# Altium footprint library mastermind.PCBLIB: 1061 footprints (part 41 of 67)
Each footprint in its own frame and in the unit in brackets; x right, y up, seen from the top. Pads: shape width x height; smd on the part's side, far side on the other; paste and mask are expansions set on the pad; w line width, h text height; cw(c..) or ccw(c..) is an arc to the next point about the centre after c.
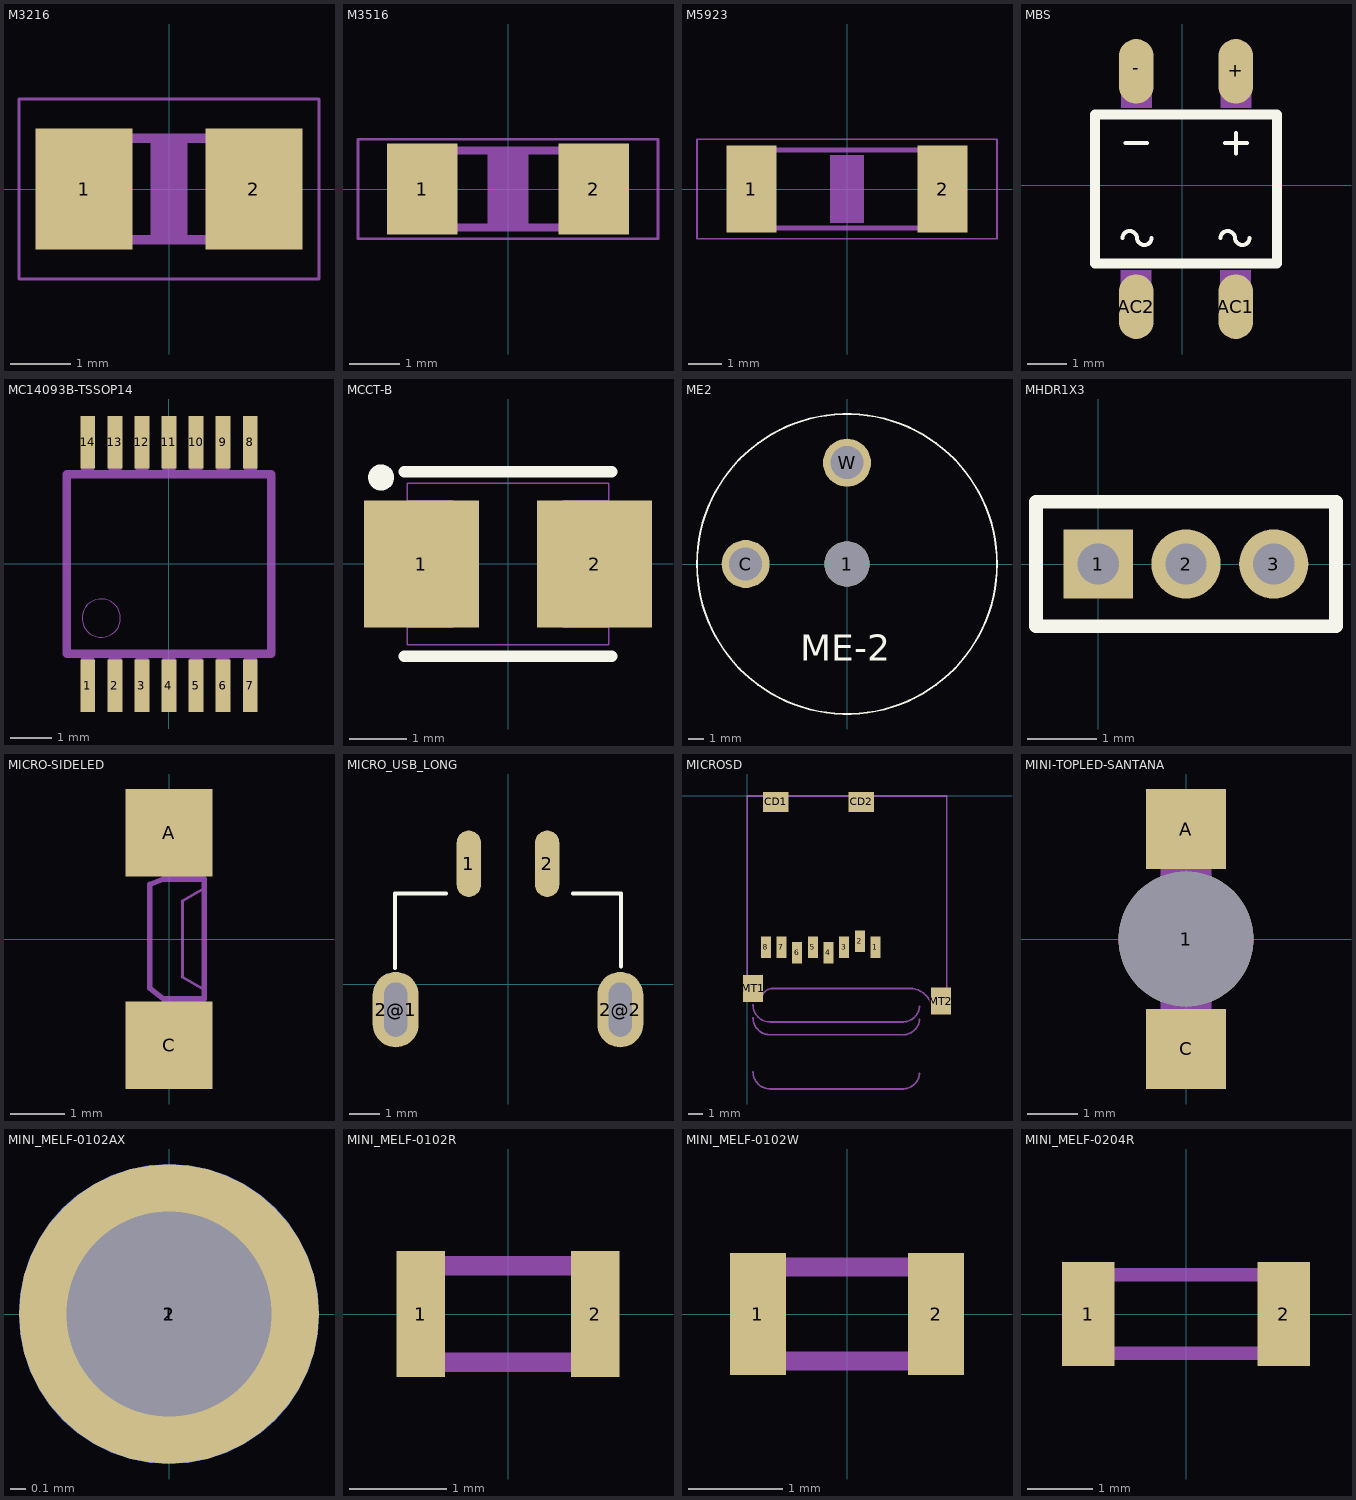
[diagram p40: the footprints below, top view; thin cyan lines are the x and y axes]

## M3216 [mm]
pads (2):
  rect 1.6x2 smd: 1(-1.4,0) 2(1.4,0)
Mechanical 8:
  region: 1.118,-0.914 1.118,0.914 1.702,0.914 1.702,-0.914
  region: -1.702,-0.914 -1.702,0.914 -1.118,0.914 -1.118,-0.914
  lines w0.152: -1.143,-0.838 1.143,-0.838 ; -1.143,0.838 1.143,0.838
Mechanical 30:
  region: -0.3,-0.8 -0.3,0.8 0.3,0.8 0.3,-0.8
Mechanical 29 (Mech34):
  lines w0.051: -2.473,-1.483 -2.473,1.483 2.473,1.483 2.473,-1.483 -2.473,-1.483

## M3516 [mm]
pads (2):
  rect 1.4x1.8 smd: 1(-1.7,0) 2(1.7,0)
Mechanical 2:
  lines w0.152: -0.686,-0.762 0.686,-0.762 ; -0.686,0.762 0.686,0.762
Mechanical 8:
  region: 1.295,-0.838 1.295,0.838 1.854,0.838 1.854,-0.838
  region: -1.854,-0.838 -1.854,0.838 -1.295,0.838 -1.295,-0.838
  lines w0.152: -1.321,-0.762 1.321,-0.762 ; -1.321,0.762 1.321,0.762
Mechanical 30:
  region: -0.4,-0.7 -0.4,0.7 0.4,0.7 0.4,-0.7
Mechanical 29 (Mech34):
  lines w0.051: -2.973,-0.983 -2.973,0.983 2.973,0.983 2.973,-0.983 -2.973,-0.983

## M5923 [mm]
pads (2):
  rect 1.5x2.6 smd: 1(-2.85,0) 2(2.85,0)
Mechanical 2:
  lines w0.152: -1.676,1.168 1.651,1.168 ; -1.651,-1.168 1.651,-1.168
Mechanical 8:
  region: 2.388,-1.245 2.388,1.245 3.048,1.245 3.048,-1.245
  region: -3.048,-1.245 -3.048,1.245 -2.388,1.245 -2.388,-1.245
  lines w0.152: -2.438,1.168 2.413,1.168 ; -2.413,-1.168 2.413,-1.168
Mechanical 30:
  region: -0.5,-1 -0.5,1 0.5,1 0.5,-1
Mechanical 29 (Mech34):
  lines w0.051: -4.473,-1.483 -4.473,1.483 4.473,1.483 4.473,-1.483 -4.473,-1.483

## MBS [mm]
pads (4):
  oval 0.889x1.651 smd: +(1.37,2.9) -(-1.17,2.9) AC1(1.37,-3.1) AC2(-1.17,-3.1)
Top Overlay:
  lines w0.102: -1.525,-1.35 cw(c-1.338,-1.362) -1.15,-1.35 ccw(c-0.962,-1.337) -0.775,-1.35 ; -1.44,1.075 -0.89,1.075 ; 0.975,-1.35 cw(c1.162,-1.362) 1.35,-1.35 ccw(c1.538,-1.337) 1.725,-1.35 ; 1.1,1.075 1.65,1.075 ; 1.375,0.8 1.375,1.325
  lines w0.254: -2.225,-2.005 -2.225,1.805 2.425,1.805 2.425,-2.005 -2.225,-2.005
Mechanical 8:
  region: 0.975,-3.605 0.975,-2.175 1.75,-2.175 1.75,-3.605
  region: -1.565,-3.605 -1.565,-2.175 -0.79,-2.175 -0.79,-3.605
  region: -0.775,3.405 -0.775,1.975 -1.55,1.975 -1.55,3.405
  region: 1.765,3.405 1.765,1.975 0.99,1.975 0.99,3.405
3D body "SOIC-4 (Fairchild).STEP": height 1.75, standoff 0, extent -2.25,-3.327 2.45,2.873

## MC14093B-TSSOP14 [mm]
pads (14):
  rect 0.36x1.26 smd mask-0.63: 1(-1.95,-2.925) 2(-1.3,-2.925) 3(-0.65,-2.925) 4(0,-2.925) 5(0.65,-2.925) 6(1.3,-2.925) 7(1.95,-2.925) 8(1.95,2.925) 9(1.3,2.925) 10(0.65,2.925) 11(0,2.925) 12(-0.65,2.925) 13(-1.3,2.925) 14(-1.95,2.925)
Top Solder:
  region: 1.7,2.2 1.7,3.6 2.2,3.6 2.2,2.2
  region: 1.05,2.2 1.05,3.6 1.55,3.6 1.55,2.2
  region: 0.4,2.2 0.4,3.6 0.9,3.6 0.9,2.2
  region: -0.25,2.2 -0.25,3.6 0.25,3.6 0.25,2.2
  region: -0.9,2.2 -0.9,3.6 -0.4,3.6 -0.4,2.2
  region: -1.55,2.2 -1.55,3.6 -1.05,3.6 -1.05,2.2
  region: -2.2,2.2 -2.2,3.6 -1.7,3.6 -1.7,2.2
  region: 1.7,-3.6 1.7,-2.2 2.2,-2.2 2.2,-3.6
  region: 1.05,-3.6 1.05,-2.2 1.55,-2.2 1.55,-3.6
  region: 0.4,-3.6 0.4,-2.2 0.9,-2.2 0.9,-3.6
  region: -0.25,-3.6 -0.25,-2.2 0.25,-2.2 0.25,-3.6
  region: -0.9,-3.6 -0.9,-2.2 -0.4,-2.2 -0.4,-3.6
  region: -1.55,-3.6 -1.55,-2.2 -1.05,-2.2 -1.05,-3.6
  region: -2.2,-3.6 -2.2,-2.2 -1.7,-2.2 -1.7,-3.6
Mechanical 2:
  circle w0: c-1.625,-1.3 r0.459
  lines w0.203: -2.45,-2.15 -2.45,2.15 2.45,2.15 2.45,-2.15 -2.45,-2.15
Mechanical 8:
  region: -1.8,3.3 -1.8,2.225 -2.1,2.225 -2.1,3.3
  region: -1.15,3.3 -1.15,2.225 -1.45,2.225 -1.45,3.3
  region: -0.5,3.3 -0.5,2.225 -0.8,2.225 -0.8,3.3
  region: 0.15,3.3 0.15,2.225 -0.15,2.225 -0.15,3.3
  region: 0.8,3.3 0.8,2.225 0.5,2.225 0.5,3.3
  region: 1.45,3.3 1.45,2.225 1.15,2.225 1.15,3.3
  region: 2.1,3.3 2.1,2.225 1.8,2.225 1.8,3.3
  region: 1.8,-3.3 1.8,-2.225 2.1,-2.225 2.1,-3.3
  region: 1.15,-3.3 1.15,-2.225 1.45,-2.225 1.45,-3.3
  region: 0.5,-3.3 0.5,-2.225 0.8,-2.225 0.8,-3.3
  region: -0.15,-3.3 -0.15,-2.225 0.15,-2.225 0.15,-3.3
  region: -0.8,-3.3 -0.8,-2.225 -0.5,-2.225 -0.5,-3.3
  region: -1.45,-3.3 -1.45,-2.225 -1.15,-2.225 -1.15,-3.3
  region: -2.1,-3.3 -2.1,-2.225 -1.8,-2.225 -1.8,-3.3

## MCCT-B [mm]
pads (2):
  rect 2x2.2 smd: 1(-1.505,-0.002) 2(1.495,-0.002)
Top Overlay:
  circle w0.25: c-2.205,1.498 r0.1
  lines w0.2: -1.805,-1.602 1.795,-1.602 ; -1.805,1.598 1.795,1.598
Mechanical 15:
  lines w0.025: -1.755,-1.102 -0.955,-1.102 -0.955,1.098 -1.755,1.098 ; 1.745,-1.102 0.945,-1.102 0.945,1.098 1.745,1.098 ; -1.755,-1.402 -1.755,1.398 1.745,1.398 1.745,-1.402 -1.755,-1.402
3D body: height 1.27, standoff 0, extent -2.286,-0.889 2.286,0.889

## ME2 [mm]
pads (3):
  round 3 hole 3 unplated: 1(0,0)
  round 3.2 hole 2.2: C(-6.753,0) W(0,6.753)
Top Overlay:
  circle w0.127: c0,0 r10
  text "ME-2" at -3.111,-7.048 h3
3D body "ME2_Gassensor.STEP": height 16.5, standoff -4, extent -10,-10 10,10

## MHDR1X3 [mm] "Connector; Header; 3 Position"
pads (3):
  rect 1x1 hole 0.6: 1(0,0)
  round 1 hole 0.6: 2(1.27,0) 3(2.54,0)
Top Overlay:
  lines w0.2: -0.9,-0.9 3.44,-0.9 3.44,0.9 -0.9,0.9 -0.9,-0.9

## MICRO-SIDELED [mm]
pads (2):
  rect 1.6x1.6 smd paste-0.8 mask-0.8: A(0,1.95) C(0,-1.95)
Top Paste:
  region: -0.35,-1.75 -0.35,-1.15 0.35,-1.15 0.35,-1.75
  region: -0.35,1.15 -0.35,1.75 0.35,1.75 0.35,1.15
Top Solder:
  region: -0.4,1.1 -0.4,1.8 0.4,1.8 0.4,1.1
  region: -0.4,-1.8 -0.4,-1.1 0.4,-1.1 0.4,-1.8
Mechanical 2:
  lines w0.051: 0.6,-0.9 0.25,-0.7 0.25,0.7 0.6,0.9
  lines w0.102: -0.35,-0.9 -0.35,1 ; 0.65,-1.1 0.65,1.1
Mechanical 8:
  region: -0.125,1.125 -0.125,1.75 0.125,1.75 0.125,1.125
  region: -0.125,-1.75 -0.125,-1.125 0.125,-1.125 0.125,-1.75
  lines w0.102: -0.35,-0.9 -0.1,-1.1 0.65,-1.1 ; -0.35,1 -0.1,1.1 0.65,1.1

## MICRO_USB_LONG [mm]
pads (4):
  oval 0.8x2.2 smd: 1(-1.3,4) 2(1.3,4)
  oval 1.524x2.5 hole 0.762 slot 1.8 at 90 deg: 2@1(-3.725,-0.84) 2@2(3.725,-0.84)
Top Overlay:
  lines w0.127: -3.75,0.546 -3.75,3.01 -2.057,3.01 ; 2.159,3.01 3.75,3.01 3.75,0.597

## MICROSD [mm]
pads (12):
  rect 0.7x1.5 smd: 1(9,-10.64) 2(7.9,-10.24) 3(6.8,-10.64) 4(5.7,-11.04) 5(4.6,-10.64) 6(3.5,-11.04) 7(2.4,-10.64) 8(1.3,-10.64)
  rect 1.8x1.4 smd: CD1(2,-0.44) CD2(8,-0.44)
  rect 1.4x1.9 smd: MT1(0.4,-13.54) MT2(13.6,-14.44)
Mechanical 2:
  lines w0.127: 0.4,-19.4 ccw(c1.6,-19.4) 1.6,-20.6 10.8,-20.6 ccw(c10.9,-19.4) 12.1,-19.5 ; 0.4,-15.6 ccw(c1.6,-15.6) 1.6,-16.8 10.8,-16.8 ccw(c10.9,-15.6) 12.1,-15.7 ; 0.4,-14.7 ccw(c1.6,-14.7) 1.6,-15.9 10.8,-15.9 ccw(c10.9,-14.7) 12.1,-14.8 ; 0,-14.44 0,-0.04 14,-0.04 14,-15.14 13,-15.14 ccw(c11.4,-15.14) 11.4,-13.54 1.7,-13.54 ccw(c1.8,-14.34) 1,-14.44 0,-14.44

## MINI-TOPLED-SANTANA [mm]
pads (3):
  round 2.7 hole 2.7: 1(0,0)
  rect 1.6x1.6 smd paste-0.8 mask-0.8: A(0,2.2) C(0,-2.2)
Top Paste:
  region: -0.5,1.55 -0.5,2.05 0.5,2.05 0.5,1.55
  region: -0.5,-2.05 -0.5,-1.55 0.5,-1.55 0.5,-2.05
Top Solder:
  region: -0.55,-2.1 -0.55,-1.5 0.55,-1.5 0.55,-2.1
  region: -0.55,1.5 -0.55,2.1 0.55,2.1 0.55,1.5
Mechanical 2:
  region: -0.5,-1.4 -0.5,-1.05 0.5,-1.05 0.5,-1.4
  region: -0.5,1 -0.5,1.4 0.5,1.4 0.5,1
  region: -0.2,-0.4 -0.2,-0.05 0.15,-0.05 0.15,-0.4
  lines w0.102: 0.35,-1 0.7,-0.65 ; 0.35,-1 -0.45,-1 -0.7,-1 -0.7,-0.75 -0.7,1 0.7,1 0.7,-0.65 ; 0.35,-1 0.7,-1 0.7,-0.65 ; -0.45,-0.7 -0.45,0.7 0.45,0.7 0.45,-0.7 -0.45,-0.7
Mechanical 8:
  region: -0.5,1.4 -0.5,2.05 0.5,2.05 0.5,1.4
  region: -0.5,-2.1 -0.5,-1.4 0.5,-1.4 0.5,-2.1

## MINI_MELF-0102AX [mm]
pads (3):
  rrect100% 1.9x1.9 smd: 1(0,0)
  round 1.3 hole 1.3: 1(0,0)
  rrect100% 1.9x1.9 smd far side: 2(0,0)
Mechanical 8:
  circle w0: c0,0 r0.6
Mechanical 9:
  circle w0: c0,0 r0.6

## MINI_MELF-0102R [mm]
pads (2):
  rect 0.5x1.3 smd: 1(-0.9,0) 2(0.9,0)
Mechanical 8:
  lines w0.203: -1,-0.5 1,-0.5 1,0.5 -1,0.5 -1,-0.5

## MINI_MELF-0102W [mm]
pads (2):
  rect 0.6x1.3 smd: 1(-0.95,0) 2(0.95,0)
Mechanical 8:
  lines w0.203: -1,-0.5 -1,0.5 1,0.5 1,-0.5 -1,-0.5

## MINI_MELF-0204R [mil]
pads (2):
  rect 31.5x62.99 smd: 1(-59.06,0) 2(59.06,0)
Mechanical 8:
  lines w8: -66.93,-23.62 -66.93,23.62 66.93,23.62 66.93,-23.62 -66.93,-23.62